# Altium integrated library Dip_Switches_rev15a.intlib: 131 symbols (part 1 of 2) (continued)
## WE-Dip Switches WS-DITU 418217170909
designator SW?
WS-DITU 2.54 mm right angled compact THT Dip Switch with flat actuator; Manufacturer: Würth Elektronik eiSos GmbH & Co.KG; ComponentLink1 Description: Manufacturer; ComponentLink2 Description: Datasheet; Creat by: Karrer Zheng; NoPins: 18; Creat Date: 13 February 2014; partNo: 418217170909; ComponentLink1URL: http://www.we-online.com; ComponentLink2URL: http://katalog.we-online.de/em/datasheet/4182171709xx.pdf
footprint 418217170909 (09p, 2.54mm Pitch, Right Angled, Box Type, THT, flat Actuator, red, without Tape, Tube)
pins: 1, 2, 3, 4, 5, 6, 7, 8, 9, 10, 11, 12, 13, 14, 15, 16, 17, 18

## WE-Dip Switches WS-DITU 418217170910
designator SW?
WS-DITU 2.54 mm right angled compact THT Dip Switch with flat actuator; Manufacturer: Würth Elektronik eiSos GmbH & Co.KG; ComponentLink1 Description: Manufacturer; ComponentLink2 Description: Datasheet; Creat by: Karrer Zheng; NoPins: 20; Creat Date: 13 February 2014; partNo: 418217170910; ComponentLink1URL: http://www.we-online.com; ComponentLink2URL: http://katalog.we-online.de/em/datasheet/4182171709xx.pdf
footprint 418217170910 (10p, 2.54mm Pitch, Right Angled, Box Type, THT,flat Actuator, red, without Tape, Tube)
pins: 1, 2, 3, 4, 5, 6, 7, 8, 9, 10, 11, 12, 13, 14, 15, 16, 17, 18, 19, 20

## WE-Dip Switches WS-DITU 418217170912
designator SW?
WS-DITU 2.54 mm right angled compact THT Dip Switch with flat actuator; Manufacturer: Würth Elektronik eiSos GmbH & Co.KG; ComponentLink1 Description: Manufacturer; ComponentLink2 Description: Datasheet; Creat by: Karrer Zheng; NoPins: 24; Creat Date: 13 February 2014; partNo: 418217170912; ComponentLink1URL: http://www.we-online.com; ComponentLink2URL: http://katalog.we-online.de/em/datasheet/4182171709xx.pdf
footprint 418217170912 (12p, 2.54mm Pitch, Right Angled, Box Type, THT, flat Actuator, red, without Tape, Tube)
pins: 1, 2, 3, 4, 5, 6, 7, 8, 9, 10, 11, 12, 13, 14, 15, 16, 17, 18, 19, 20, 21, 22, 23, 24


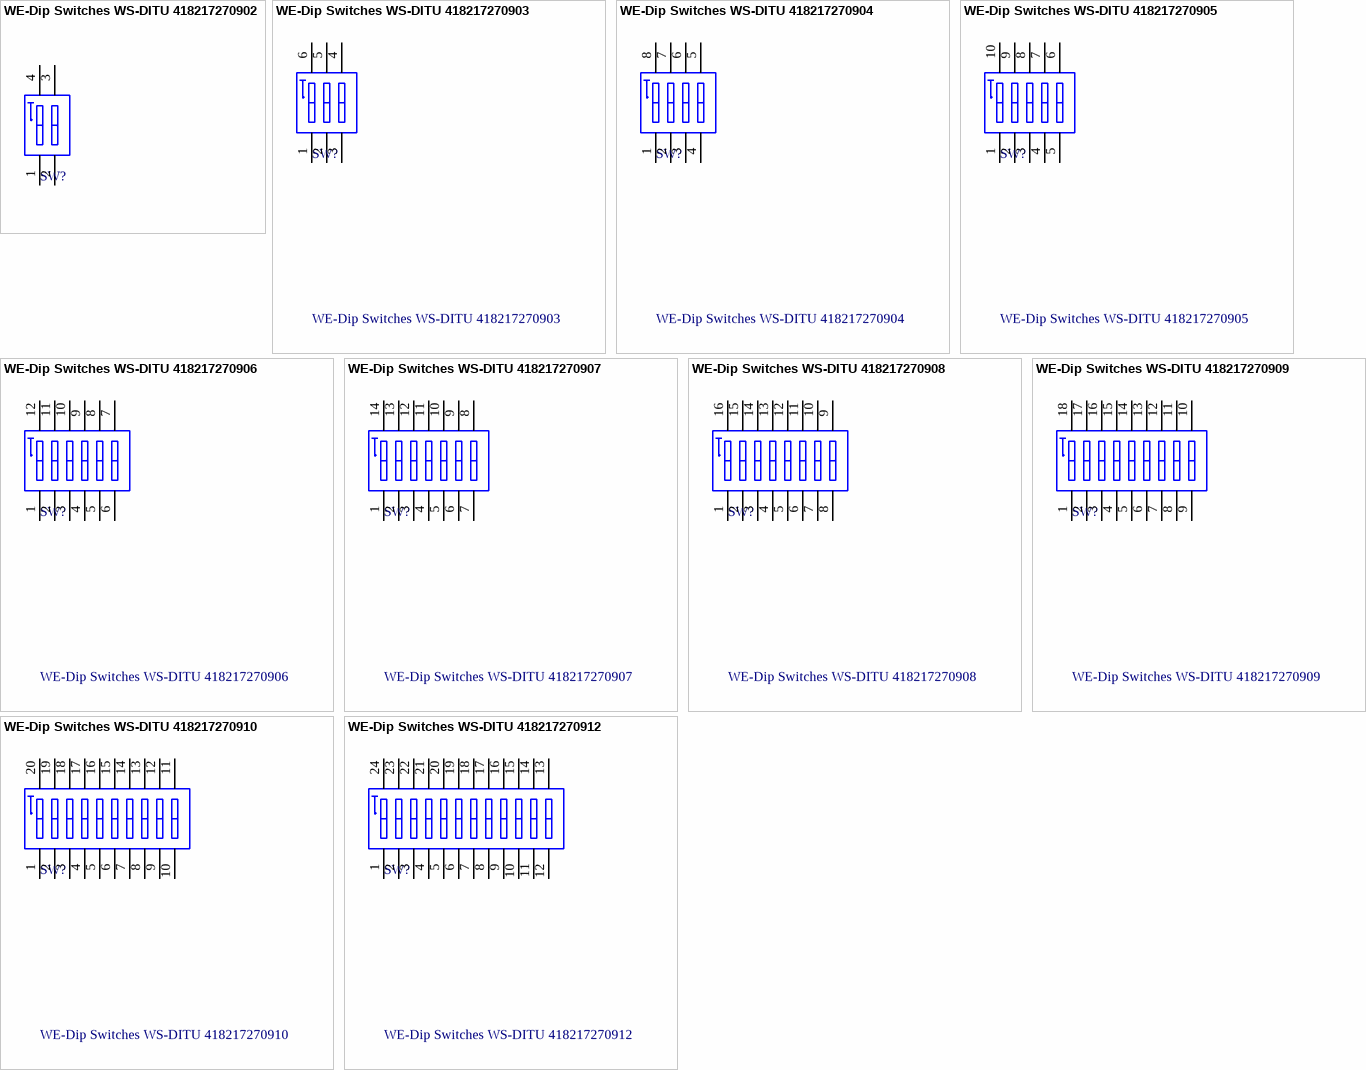
[diagram p6: symbols WE-Dip Switches WS-DITU 418217270902 to WE-Dip Switches WS-DITU 418217270912]

## WE-Dip Switches WS-DITU 418217270902
designator SW?
WS-DITU 2.54 mm right angled compact THT Dip Switch with raised actuator; Manufacturer: Würth Elektronik eiSos GmbH & Co.KG; ComponentLink1 Description: Manufacturer; ComponentLink2 Description: Datasheet; Creat by: Karrer Zheng; NoPins: 4; Creat Date: 13 February 2014; partNo: 418217270902; ComponentLink1URL: http://www.we-online.com; ComponentLink2URL: http://katalog.we-online.de/em/datasheet/4182172709xx.pdf
footprint 418217270902 (02p, 2.54mm Pitch, Right Angled, Box Type, THT, raised Actuator, red, without Tape, Tube)
pins: 1, 2, 3, 4

## WE-Dip Switches WS-DITU 418217270903
designator SW?
WS-DITU 2.54 mm right angled compact THT Dip Switch with raised actuator; Manufacturer: Würth Elektronik eiSos GmbH & Co.KG; ComponentLink1 Description: Manufacturer; ComponentLink2 Description: Datasheet; Creat by: Karrer Zheng; NoPins: 6; Creat Date: 13 February 2014; partNo: 418217270903; ComponentLink1URL: http://www.we-online.com; ComponentLink2URL: http://katalog.we-online.de/em/datasheet/4182172709xx.pdf
footprint 418217270903 (03p, 2.54mm Pitch, Right Angled, Box Type, THT, raised Actuator, red, without Tape, Tube)
pins: 1, 2, 3, 4, 5, 6

## WE-Dip Switches WS-DITU 418217270904
designator SW?
WS-DITU 2.54 mm right angled compact THT Dip Switch with raised actuator; Manufacturer: Würth Elektronik eiSos GmbH & Co.KG; ComponentLink1 Description: Manufacturer; ComponentLink2 Description: Datasheet; Creat by: Karrer Zheng; NoPins: 8; Creat Date: 13 February 2014; partNo: 418217270904; ComponentLink1URL: http://www.we-online.com; ComponentLink2URL: http://katalog.we-online.de/em/datasheet/4182172709xx.pdf
footprint 418217270904 (04p, 2.54mm Pitch, Right Angled, Box Type, THT, raised Actuator, red, without Tape, Tube)
pins: 1, 2, 3, 4, 5, 6, 7, 8

## WE-Dip Switches WS-DITU 418217270905
designator SW?
WS-DITU 2.54 mm right angled compact THT Dip Switch with raised actuator; Manufacturer: Würth Elektronik eiSos GmbH & Co.KG; ComponentLink1 Description: Manufacturer; ComponentLink2 Description: Datasheet; Creat by: Karrer Zheng; NoPins: 10; Creat Date: 13 February 2014; partNo: 418217270905; ComponentLink1URL: http://www.we-online.com; ComponentLink2URL: http://katalog.we-online.de/em/datasheet/4182172709xx.pdf
footprint 418217270905 (05p, 2.54mm Pitch, Right Angled, Box Type, THT, raised Actuator, red, without Tape, Tube)
pins: 1, 2, 3, 4, 5, 6, 7, 8, 9, 10

## WE-Dip Switches WS-DITU 418217270906
designator SW?
WS-DITU 2.54 mm right angled compact THT Dip Switch with raised actuator; Manufacturer: Würth Elektronik eiSos GmbH & Co.KG; ComponentLink1 Description: Manufacturer; ComponentLink2 Description: Datasheet; Creat by: Karrer Zheng; NoPins: 12; Creat Date: 13 February 2014; partNo: 418217270906; ComponentLink1URL: http://www.we-online.com; ComponentLink2URL: http://katalog.we-online.de/em/datasheet/4182172709xx.pdf
footprint 418217270906 (06p, 2.54mm Pitch, Right Angled, Box Type, THT, raised Actuator, red, without Tape, Tube)
pins: 1, 2, 3, 4, 5, 6, 7, 8, 9, 10, 11, 12

## WE-Dip Switches WS-DITU 418217270907
designator SW?
WS-DITU 2.54 mm right angled compact THT Dip Switch with raised actuator; Manufacturer: Würth Elektronik eiSos GmbH & Co.KG; ComponentLink1 Description: Manufacturer; ComponentLink2 Description: Datasheet; Creat by: Karrer Zheng; NoPins: 14; Creat Date: 13 February 2014; partNo: 418217270907; ComponentLink1URL: http://www.we-online.com; ComponentLink2URL: http://katalog.we-online.de/em/datasheet/4182172709xx.pdf
footprint 418217270907 (07p, 2.54mm Pitch, Right Angled, Box Type, THT, raised Actuator, red, without Tape, Tube)
pins: 1, 2, 3, 4, 5, 6, 7, 8, 9, 10, 11, 12, 13, 14

## WE-Dip Switches WS-DITU 418217270908
designator SW?
WS-DITU 2.54 mm right angled compact THT Dip Switch with raised actuator; Manufacturer: Würth Elektronik eiSos GmbH & Co.KG; ComponentLink1 Description: Manufacturer; ComponentLink2 Description: Datasheet; Creat by: Karrer Zheng; NoPins: 16; Creat Date: 13 February 2014; partNo: 418217270908; ComponentLink1URL: http://www.we-online.com; ComponentLink2URL: http://katalog.we-online.de/em/datasheet/4182172709xx.pdf
footprint 418217270908 (08p, 2.54mm Pitch, Right Angled, Box Type, THT, raised Actuator, red, without Tape, Tube)
pins: 1, 2, 3, 4, 5, 6, 7, 8, 9, 10, 11, 12, 13, 14, 15, 16

## WE-Dip Switches WS-DITU 418217270909
designator SW?
WS-DITU 2.54 mm right angled compact THT Dip Switch with raised actuator; Manufacturer: Würth Elektronik eiSos GmbH & Co.KG; ComponentLink1 Description: Manufacturer; ComponentLink2 Description: Datasheet; Creat by: Karrer Zheng; NoPins: 18; Creat Date: 13 February 2014; partNo: 418217270909; ComponentLink1URL: http://www.we-online.com; ComponentLink2URL: http://katalog.we-online.de/em/datasheet/4182172709xx.pdf
footprint 418217270909 (09p, 2.54mm Pitch, Right Angled, Box Type, THT, raised Actuator, red, without Tape, Tube)
pins: 1, 2, 3, 4, 5, 6, 7, 8, 9, 10, 11, 12, 13, 14, 15, 16, 17, 18

## WE-Dip Switches WS-DITU 418217270910
designator SW?
WS-DITU 2.54 mm right angled compact THT Dip Switch with raised actuator; Manufacturer: Würth Elektronik eiSos GmbH & Co.KG; ComponentLink1 Description: Manufacturer; ComponentLink2 Description: Datasheet; Creat by: Karrer Zheng; NoPins: 20; Creat Date: 13 February 2014; partNo: 418217270910; ComponentLink1URL: http://www.we-online.com; ComponentLink2URL: http://katalog.we-online.de/em/datasheet/4182172709xx.pdf
footprint 418217270910 (10p, 2.54mm Pitch, Right Angled, Box Type, THT, raised Actuator, red, without Tape, Tube)
pins: 1, 2, 3, 4, 5, 6, 7, 8, 9, 10, 11, 12, 13, 14, 15, 16, 17, 18, 19, 20

## WE-Dip Switches WS-DITU 418217270912
designator SW?
WS-DITU 2.54 mm right angled compact THT Dip Switch with raised actuator; Manufacturer: Würth Elektronik eiSos GmbH & Co.KG; ComponentLink1 Description: Manufacturer; ComponentLink2 Description: Datasheet; Creat by: Karrer Zheng; NoPins: 24; Creat Date: 13 February 2014; partNo: 418217270912; ComponentLink1URL: http://www.we-online.com; ComponentLink2URL: http://katalog.we-online.de/em/datasheet/4182172709xx.pdf
footprint 418217270912 (12p, 2.54mm Pitch, Right Angled, Box Type, THT, raised Actuator, red, without Tape, Tube)
pins: 1, 2, 3, 4, 5, 6, 7, 8, 9, 10, 11, 12, 13, 14, 15, 16, 17, 18, 19, 20, 21, 22, 23, 24


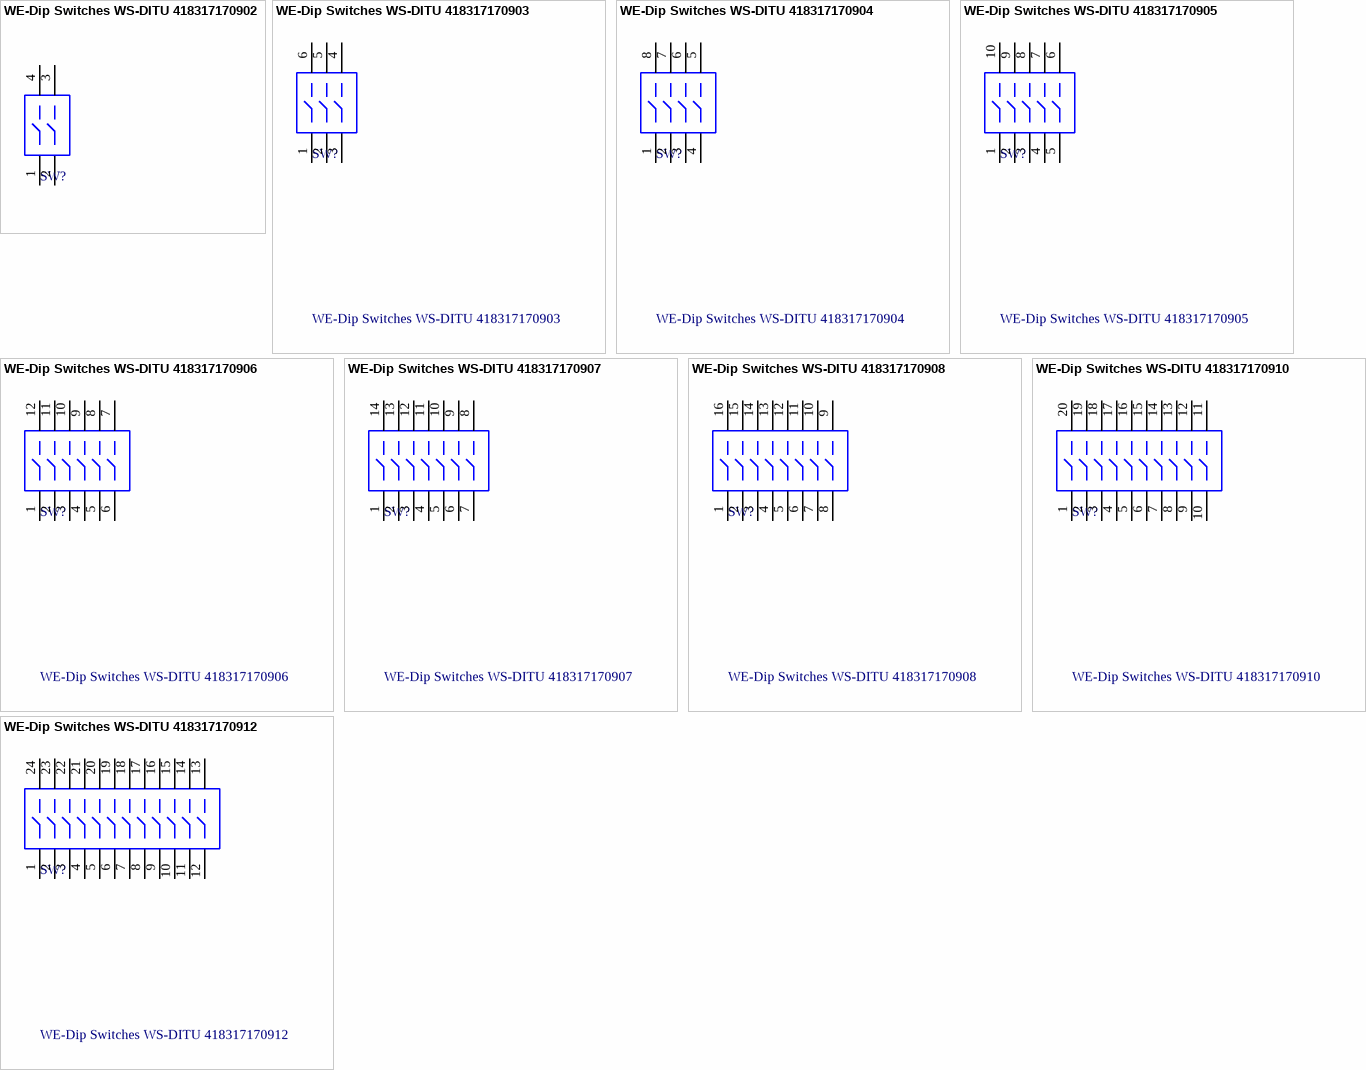
[diagram p7: symbols WE-Dip Switches WS-DITU 418317170902 to WE-Dip Switches WS-DITU 418317170912]

## WE-Dip Switches WS-DITU 418317170902
designator SW?
WS-DITU 2.54 mm piano type compact THT Dip Switch with flat actuator; Manufacturer: Würth Elektronik eiSos GmbH & Co.KG; ComponentLink1 Description: Manufacturer; ComponentLink2 Description: Datasheet; Creat by: Karrer Zheng; NoPins: 04; Creat Date: 14 February 2014; partNo: 418317170902; ComponentLink1URL: http://www.we-online.com; ComponentLink2URL: http://katalog.we-online.de/em/datasheet/4183171709xx.pdf
footprint 418317170902 (02p, 2.54mm Pitch, Piano, Box Type, THT, flat Actuator, black, without Tape, Tube)
pins: 1, 2, 3, 4

## WE-Dip Switches WS-DITU 418317170903
designator SW?
WS-DITU 2.54 mm piano type compact THT Dip Switch with flat actuator; Manufacturer: Würth Elektronik eiSos GmbH & Co.KG; ComponentLink1 Description: Manufacturer; ComponentLink2 Description: Datasheet; Creat by: Karrer Zheng; NoPins: 6; Creat Date: 14 February 2014; partNo: 418317170903; ComponentLink1URL: http://www.we-online.com; ComponentLink2URL: http://katalog.we-online.de/em/datasheet/4183171709xx.pdf
footprint 418317170903 (03p, 2.54mm Pitch, Piano, Box Type, THT, flat Actuator, black, without Tape, Tube)
pins: 1, 2, 3, 4, 5, 6

## WE-Dip Switches WS-DITU 418317170904
designator SW?
WS-DITU 2.54 mm piano type compact THT Dip Switch with flat actuator; Manufacturer: Würth Elektronik eiSos GmbH & Co.KG; ComponentLink1 Description: Manufacturer; ComponentLink2 Description: Datasheet; Creat by: Karrer Zheng; NoPins: 8; Creat Date: 14 February 2014; partNo: 418317170904; ComponentLink1URL: http://www.we-online.com; ComponentLink2URL: http://katalog.we-online.de/em/datasheet/4183171709xx.pdf
footprint 418317170904 (04p, 2.54mm Pitch, Piano, Box Type, THT, flat Actuator, black, without Tape, Tube)
pins: 1, 2, 3, 4, 5, 6, 7, 8

## WE-Dip Switches WS-DITU 418317170905
designator SW?
WS-DITU 2.54 mm piano type compact THT Dip Switch with flat actuator; Manufacturer: Würth Elektronik eiSos GmbH & Co.KG; ComponentLink1 Description: Manufacturer; ComponentLink2 Description: Datasheet; Creat by: Karrer Zheng; NoPins: 10; Creat Date: 14 February 2014; partNo: 418317170905; ComponentLink1URL: http://www.we-online.com; ComponentLink2URL: http://katalog.we-online.de/em/datasheet/4183171709xx.pdf
footprint 418317170905 (05p, 2.54mm Pitch, Piano, Box Type, THT, flat Actuator, black, without Tape, Tube)
pins: 1, 2, 3, 4, 5, 6, 7, 8, 9, 10

## WE-Dip Switches WS-DITU 418317170906
designator SW?
WS-DITU 2.54 mm piano type compact THT Dip Switch with flat actuator; Manufacturer: Würth Elektronik eiSos GmbH & Co.KG; ComponentLink1 Description: Manufacturer; ComponentLink2 Description: Datasheet; Creat by: Karrer Zheng; NoPins: 12; Creat Date: 14 February 2014; partNo: 418317170906; ComponentLink1URL: http://www.we-online.com; ComponentLink2URL: http://katalog.we-online.de/em/datasheet/4183171709xx.pdf
footprint 418317170906 (06p, 2.54mm Pitch, Piano, Box Type, THT, flat Actuator, black, without Tape, Tube)
pins: 1, 2, 3, 4, 5, 6, 7, 8, 9, 10, 11, 12

## WE-Dip Switches WS-DITU 418317170907
designator SW?
WS-DITU 2.54 mm piano type compact THT Dip Switch with flat actuator; Manufacturer: Würth Elektronik eiSos GmbH & Co.KG; ComponentLink1 Description: Manufacturer; ComponentLink2 Description: Datasheet; Creat by: Karrer Zheng; NoPins: 14; Creat Date: 14 February 2014; partNo: 418317170907; ComponentLink1URL: http://www.we-online.com; ComponentLink2URL: http://katalog.we-online.de/em/datasheet/4183171709xx.pdf
footprint 418317170907 (07p, 2.54mm Pitch, Piano, Box Type, THT, flat Actuator, black, without Tape, Tube)
pins: 1, 2, 3, 4, 5, 6, 7, 8, 9, 10, 11, 12, 13, 14

## WE-Dip Switches WS-DITU 418317170908
designator SW?
WS-DITU 2.54 mm piano type compact THT Dip Switch with flat actuator; Manufacturer: Würth Elektronik eiSos GmbH & Co.KG; ComponentLink1 Description: Manufacturer; ComponentLink2 Description: Datasheet; Creat by: Karrer Zheng; NoPins: 16; Creat Date: 14 February 2014; partNo: 418317170908; ComponentLink1URL: http://www.we-online.com; ComponentLink2URL: http://katalog.we-online.de/em/datasheet/4183171709xx.pdf
footprint 418317170908 (08p, 2.54mm Pitch, Piano, Box Type, THT, flat Actuator, black, without Tape, Tube)
pins: 1, 2, 3, 4, 5, 6, 7, 8, 9, 10, 11, 12, 13, 14, 15, 16

## WE-Dip Switches WS-DITU 418317170910
designator SW?
WS-DITU 2.54 mm piano type compact THT Dip Switch with flat actuator; Manufacturer: Würth Elektronik eiSos GmbH & Co.KG; ComponentLink1 Description: Manufacturer; ComponentLink2 Description: Datasheet; Creat by: Karrer Zheng; NoPins: 20; Creat Date: 14 February 2014; partNo: 418317170910; ComponentLink1URL: http://www.we-online.com; ComponentLink2URL: http://katalog.we-online.de/em/datasheet/4183171709xx.pdf
footprint 418317170910 (10p, 2.54mm Pitch, Piano, Box Type, THT, flat Actuator, black, without Tape, Tube)
pins: 1, 2, 3, 4, 5, 6, 7, 8, 9, 10, 11, 12, 13, 14, 15, 16, 17, 18, 19, 20

## WE-Dip Switches WS-DITU 418317170912
designator SW?
WS-DITU 2.54 mm piano type compact THT Dip Switch with flat actuator; Manufacturer: Würth Elektronik eiSos GmbH & Co.KG; ComponentLink1 Description: Manufacturer; ComponentLink2 Description: Datasheet; Creat by: Karrer Zheng; NoPins: 24; Creat Date: 14 February 2014; partNo: 418317170912; ComponentLink1URL: http://www.we-online.com; ComponentLink2URL: http://katalog.we-online.de/em/datasheet/4183171709xx.pdf
footprint 418317170912 (12p, 2.54mm Pitch, Piano, Box Type, THT, flat Actuator, black, without Tape, Tube)
pins: 1, 2, 3, 4, 5, 6, 7, 8, 9, 10, 11, 12, 13, 14, 15, 16, 17, 18, 19, 20, 21, 22, 23, 24


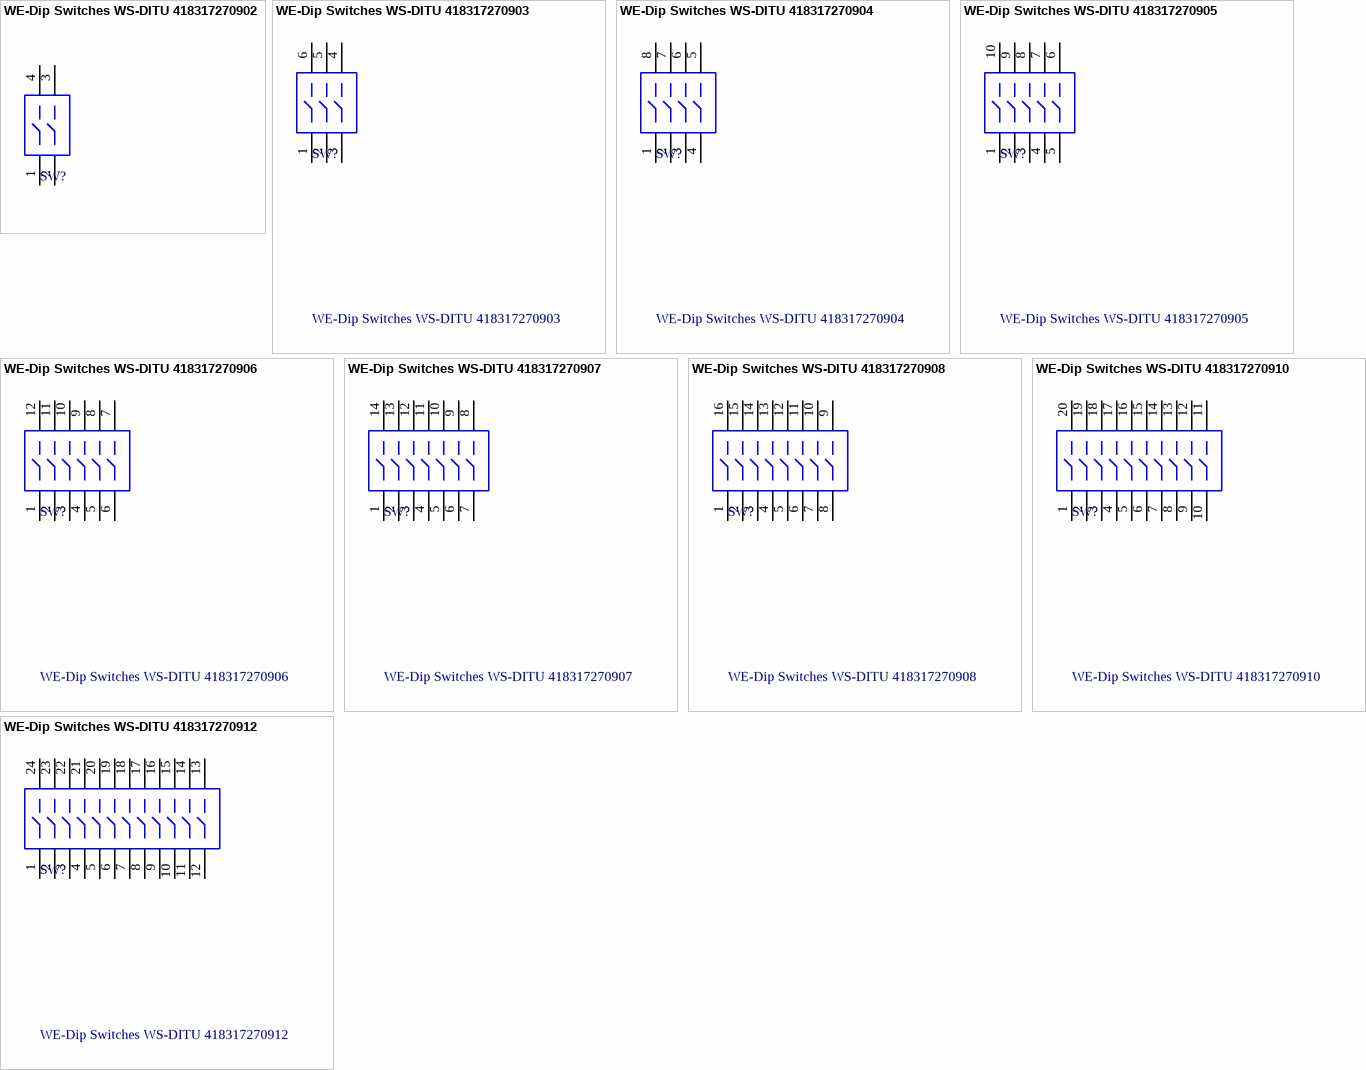
[diagram p8: symbols WE-Dip Switches WS-DITU 418317270902 to WE-Dip Switches WS-DITU 418317270912]

## WE-Dip Switches WS-DITU 418317270902
designator SW?
WS-DITU 2.54 mm piano type compact THT Dip Switch with raised actuator; Manufacturer: Würth Elektronik eiSos GmbH & Co.KG; ComponentLink1 Description: Manufacturer; ComponentLink2 Description: Datasheet; Creat by: Karrer Zheng; NoPins: 4; Creat Date: 14 February 2014; partNo: 418317270902; ComponentLink1URL: http://www.we-online.com; ComponentLink2URL: http://katalog.we-online.de/em/datasheet/4183172709xx.pdf
footprint 418317270902 (02p, 2.54mm Pitch, Piano, Box Type, THT, raised Actuator, black, without Tape, Tube)
pins: 1, 2, 3, 4

## WE-Dip Switches WS-DITU 418317270903
designator SW?
WS-DITU 2.54 mm piano type compact THT Dip Switch with raised actuator; Manufacturer: Würth Elektronik eiSos GmbH & Co.KG; ComponentLink1 Description: Manufacturer; ComponentLink2 Description: Datasheet; Creat by: Karrer Zheng; NoPins: 6; Creat Date: 14 February 2014; partNo: 418317270903; ComponentLink1URL: http://www.we-online.com; ComponentLink2URL: http://katalog.we-online.de/em/datasheet/4183172709xx.pdf
footprint 418317270903 (03p, 2.54mm Pitch, Piano, Box Type, THT, raised Actuator, black, without Tape, Tube)
pins: 1, 2, 3, 4, 5, 6

## WE-Dip Switches WS-DITU 418317270904
designator SW?
WS-DITU 2.54 mm piano type compact THT Dip Switch with raised actuator; Manufacturer: Würth Elektronik eiSos GmbH & Co.KG; ComponentLink1 Description: Manufacturer; ComponentLink2 Description: Datasheet; Creat by: Karrer Zheng; NoPins: 8; Creat Date: 14 February 2014; partNo: 418317270904; ComponentLink1URL: http://www.we-online.com; ComponentLink2URL: http://katalog.we-online.de/em/datasheet/4183172709xx.pdf
footprint 418317270904 (04p, 2.54mm Pitch, Piano, Box Type, THT, raised Actuator, black, without Tape, Tube)
pins: 1, 2, 3, 4, 5, 6, 7, 8

## WE-Dip Switches WS-DITU 418317270905
designator SW?
WS-DITU 2.54 mm piano type compact THT Dip Switch with raised actuator; Manufacturer: Würth Elektronik eiSos GmbH & Co.KG; ComponentLink1 Description: Manufacturer; ComponentLink2 Description: Datasheet; Creat by: Karrer Zheng; NoPins: 10; Creat Date: 14 February 2014; partNo: 418317270905; ComponentLink1URL: http://www.we-online.com; ComponentLink2URL: http://katalog.we-online.de/em/datasheet/4183172709xx.pdf
footprint 418317270905 (05p, 2.54mm Pitch, Piano, Box Type, THT, raised Actuator, black, without Tape, Tube)
pins: 1, 2, 3, 4, 5, 6, 7, 8, 9, 10

## WE-Dip Switches WS-DITU 418317270906
designator SW?
WS-DITU 2.54 mm piano type compact THT Dip Switch with raised actuator; Manufacturer: Würth Elektronik eiSos GmbH & Co.KG; ComponentLink1 Description: Manufacturer; ComponentLink2 Description: Datasheet; Creat by: Karrer Zheng; NoPins: 12; Creat Date: 14 February 2014; partNo: 418317270906; ComponentLink1URL: http://www.we-online.com; ComponentLink2URL: http://katalog.we-online.de/em/datasheet/4183172709xx.pdf
footprint 418317270906 (06p, 2.54mm Pitch, Piano, Box Type, THT, raised Actuator, black, without Tape, Tube)
pins: 1, 2, 3, 4, 5, 6, 7, 8, 9, 10, 11, 12

## WE-Dip Switches WS-DITU 418317270907
designator SW?
WS-DITU 2.54 mm piano type compact THT Dip Switch with raised actuator; Manufacturer: Würth Elektronik eiSos GmbH & Co.KG; ComponentLink1 Description: Manufacturer; ComponentLink2 Description: Datasheet; Creat by: Karrer Zheng; NoPins: 14; Creat Date: 14 February 2014; partNo: 418317270907; ComponentLink1URL: http://www.we-online.com; ComponentLink2URL: http://katalog.we-online.de/em/datasheet/4183172709xx.pdf
footprint 418317270907 (07p, 2.54mm Pitch, Piano, Box Type, THT, raised Actuator, black, without Tape, Tube)
pins: 1, 2, 3, 4, 5, 6, 7, 8, 9, 10, 11, 12, 13, 14

## WE-Dip Switches WS-DITU 418317270908
designator SW?
WS-DITU 2.54 mm piano type compact THT Dip Switch with raised actuator; Manufacturer: Würth Elektronik eiSos GmbH & Co.KG; ComponentLink1 Description: Manufacturer; ComponentLink2 Description: Datasheet; Creat by: Karrer Zheng; NoPins: 16; Creat Date: 14 February 2014; partNo: 418317270908; ComponentLink1URL: http://www.we-online.com; ComponentLink2URL: http://katalog.we-online.de/em/datasheet/4183172709xx.pdf
footprint 418317270908 (08p, 2.54mm Pitch, Piano, Box Type, THT, raised Actuator, black, without Tape, Tube)
pins: 1, 2, 3, 4, 5, 6, 7, 8, 9, 10, 11, 12, 13, 14, 15, 16

## WE-Dip Switches WS-DITU 418317270910
designator SW?
WS-DITU 2.54 mm piano type compact THT Dip Switch with raised actuator; Manufacturer: Würth Elektronik eiSos GmbH & Co.KG; ComponentLink1 Description: Manufacturer; ComponentLink2 Description: Datasheet; Creat by: Karrer Zheng; NoPins: 20; Creat Date: 14 February 2014; partNo: 418317270910; ComponentLink1URL: http://www.we-online.com; ComponentLink2URL: http://katalog.we-online.de/em/datasheet/4183172709xx.pdf
footprint 418317270910 (10p, 2.54mm Pitch, Piano, Box Type, THT, raised Actuator, black, without Tape, Tube)
pins: 1, 2, 3, 4, 5, 6, 7, 8, 9, 10, 11, 12, 13, 14, 15, 16, 17, 18, 19, 20

## WE-Dip Switches WS-DITU 418317270912
designator SW?
WS-DITU 2.54 mm piano type compact THT Dip Switch with raised actuator; Manufacturer: Würth Elektronik eiSos GmbH & Co.KG; ComponentLink1 Description: Manufacturer; ComponentLink2 Description: Datasheet; Creat by: Karrer Zheng; NoPins: 24; Creat Date: 14 February 2014; partNo: 418317270912; ComponentLink1URL: http://www.we-online.com; ComponentLink2URL: http://katalog.we-online.de/em/datasheet/4183172709xx.pdf
footprint 418317270912 (12p, 2.54mm Pitch, Piano, Box Type, THT, raised Actuator, black, without Tape, Tube)
pins: 1, 2, 3, 4, 5, 6, 7, 8, 9, 10, 11, 12, 13, 14, 15, 16, 17, 18, 19, 20, 21, 22, 23, 24


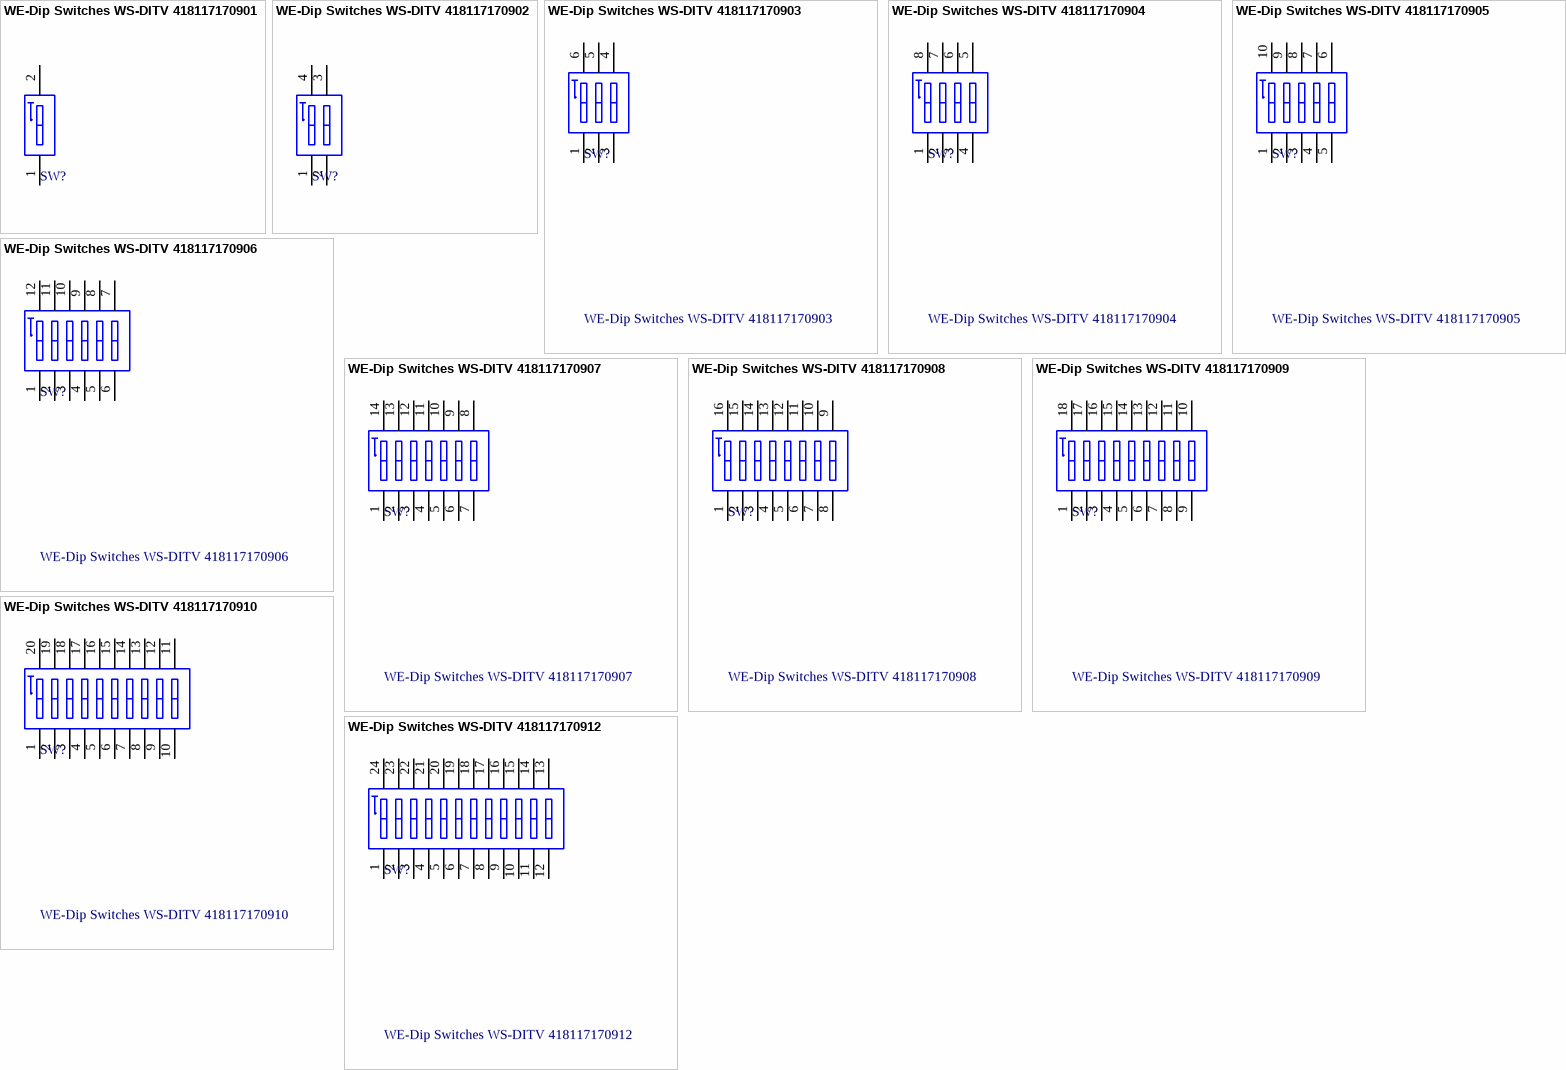
[diagram p9: symbols WE-Dip Switches WS-DITV 418117170901 to WE-Dip Switches WS-DITV 418117170912]

## WE-Dip Switches WS-DITV 418117170901
designator SW?
2.54 mm Compact THT Dip Switch with Flat Actuator WS-DITV; Manufacturer: Würth Elektronik eiSos GmbH & Co.KG; ComponentLink1 Description: Manufacturer; ComponentLink2 Description: Datasheet; Creat by: Karrer Zheng; NoPins: 2; Creat Date: 18 December 2013; partNo: 418117170901; ComponentLink1URL: http://www.we-online.com; ComponentLink2URL: http://katalog.we-online.de/em/datasheet/4181171709xx.pdf
footprint 418117170901 (01p, 2.54mm Pitch, Horizontal, Box Type, THT, flat Actuator, red, without Tape, Tube)
pins: 1, 2

## WE-Dip Switches WS-DITV 418117170902
designator SW?
2.54 mm Compact THT Dip Switch with Flat Actuator WS-DITV; Manufacturer: Würth Elektronik eiSos GmbH & Co.KG; ComponentLink1 Description: Manufacturer; ComponentLink2 Description: Datasheet; Creat by: Karrer Zheng; NoPins: 4; Creat Date: 18 December 2013; partNo: 418117170902; ComponentLink1URL: http://www.we-online.com; ComponentLink2URL: http://katalog.we-online.de/em/datasheet/4181171709xx.pdf
footprint 418117170902 (02p, 2.54mm Pitch, Horizontal, Box Type, THT, flat Actuator, red, without Tape, Tube)
pins: 1, 2, 3, 4

## WE-Dip Switches WS-DITV 418117170903
designator SW?
2.54 mm Compact THT Dip Switch with Flat Actuator WS-DITV; Manufacturer: Würth Elektronik eiSos GmbH & Co.KG; ComponentLink1 Description: Manufacturer; ComponentLink2 Description: Datasheet; Creat by: Karrer Zheng; NoPins: 6; Creat Date: 18 December 2013; partNo: 418117170903; ComponentLink1URL: http://www.we-online.com; ComponentLink2URL: http://katalog.we-online.de/em/datasheet/4181171709xx.pdf
footprint 418117170903 (03p, 2.54mm Pitch, Horizontal, Box Type, THT, flat Actuator, red, without Tape, Tube)
pins: 1, 2, 3, 4, 5, 6

## WE-Dip Switches WS-DITV 418117170904
designator SW?
2.54 mm Compact THT Dip Switch with Flat Actuator WS-DITV; Manufacturer: Würth Elektronik eiSos GmbH & Co.KG; ComponentLink1 Description: Manufacturer; ComponentLink2 Description: Datasheet; Creat by: Karrer Zheng; NoPins: 8; Creat Date: 18 December 2013; partNo: 418117170904; ComponentLink1URL: http://www.we-online.com; ComponentLink2URL: http://katalog.we-online.de/em/datasheet/4181171709xx.pdf
footprint 418117170904 (04p, 2.54mm Pitch, Horizontal, Box Type, THT, flat Actuator, red, without Tape, Tube)
pins: 1, 2, 3, 4, 5, 6, 7, 8

## WE-Dip Switches WS-DITV 418117170905
designator SW?
2.54 mm Compact THT Dip Switch with Flat Actuator WS-DITV; Manufacturer: Würth Elektronik eiSos GmbH & Co.KG; ComponentLink1 Description: Manufacturer; ComponentLink2 Description: Datasheet; Creat by: Karrer Zheng; NoPins: 10; Creat Date: 18 December 2013; partNo: 418117170905; ComponentLink1URL: http://www.we-online.com; ComponentLink2URL: http://katalog.we-online.de/em/datasheet/4181171709xx.pdf
footprint 418117170905 (05p, 2.54mm Pitch, Horizontal, Box Type, THT, flat Actuator, red, without Tape, Tube)
pins: 1, 2, 3, 4, 5, 6, 7, 8, 9, 10

## WE-Dip Switches WS-DITV 418117170906
designator SW?
2.54 mm Compact THT Dip Switch with Flat Actuator WS-DITV; Manufacturer: Würth Elektronik eiSos GmbH & Co.KG; ComponentLink1 Description: Manufacturer; ComponentLink2 Description: Datasheet; Creat by: Karrer Zheng; NoPins: 12; Creat Date: 18 December 2013; partNo: 418117170906; ComponentLink1URL: http://www.we-online.com; ComponentLink2URL: http://katalog.we-online.de/em/datasheet/4181171709xx.pdf
footprint 418117170906 (06p, 2.54mm Pitch, Horizontal, Box Type, THT, flat Actuator, red, without Tape, Tube)
pins: 1, 2, 3, 4, 5, 6, 7, 8, 9, 10, 11, 12

## WE-Dip Switches WS-DITV 418117170907
designator SW?
2.54 mm Compact THT Dip Switch with Flat Actuator WS-DITV; Manufacturer: Würth Elektronik eiSos GmbH & Co.KG; ComponentLink1 Description: Manufacturer; ComponentLink2 Description: Datasheet; Creat by: Karrer Zheng; NoPins: 14; Creat Date: 18 December 2013; partNo: 418117170907; ComponentLink1URL: http://www.we-online.com; ComponentLink2URL: http://katalog.we-online.de/em/datasheet/4181171709xx.pdf
footprint 418117170907 (07p, 2.54mm Pitch, Horizontal, Box Type, THT, flat Actuator, red, without Tape, Tube)
pins: 1, 2, 3, 4, 5, 6, 7, 8, 9, 10, 11, 12, 13, 14

## WE-Dip Switches WS-DITV 418117170908
designator SW?
2.54 mm Compact THT Dip Switch with Flat Actuator WS-DITV; Manufacturer: Würth Elektronik eiSos GmbH & Co.KG; ComponentLink1 Description: Manufacturer; ComponentLink2 Description: Datasheet; Creat by: Karrer Zheng; NoPins: 16; Creat Date: 18 December 2013; partNo: 418117170908; ComponentLink1URL: http://www.we-online.com; ComponentLink2URL: http://katalog.we-online.de/em/datasheet/4181171709xx.pdf
footprint 418117170908 (08p, 2.54mm Pitch, Horizontal, Box Type, THT, flat Actuator, red, without Tape, Tube)
pins: 1, 2, 3, 4, 5, 6, 7, 8, 9, 10, 11, 12, 13, 14, 15, 16

## WE-Dip Switches WS-DITV 418117170909
designator SW?
2.54 mm Compact THT Dip Switch with Flat Actuator WS-DITV; Manufacturer: Würth Elektronik eiSos GmbH & Co.KG; ComponentLink1 Description: Manufacturer; ComponentLink2 Description: Datasheet; Creat by: Karrer Zheng; NoPins: 18; Creat Date: 18 December 2013; partNo: 418117170909; ComponentLink1URL: http://www.we-online.com; ComponentLink2URL: http://katalog.we-online.de/em/datasheet/4181171709xx.pdf
footprint 418117170909 (09p, 2.54mm Pitch, Horizontal, Box Type, THT, flat Actuator, red, without Tape, Tube)
pins: 1, 2, 3, 4, 5, 6, 7, 8, 9, 10, 11, 12, 13, 14, 15, 16, 17, 18

## WE-Dip Switches WS-DITV 418117170910
designator SW?
2.54 mm Compact THT Dip Switch with Flat Actuator WS-DITV; Manufacturer: Würth Elektronik eiSos GmbH & Co.KG; ComponentLink1 Description: Manufacturer; ComponentLink2 Description: Datasheet; Creat by: Karrer Zheng; NoPins: 20; Creat Date: 18 December 2013; partNo: 418117170910; ComponentLink1URL: http://www.we-online.com; ComponentLink2URL: http://katalog.we-online.de/em/datasheet/4181171709xx.pdf
footprint 418117170910 (10p, 2.54mm Pitch, Horizontal, Box Type, THT, flat Actuator, red, without Tape, Tube)
pins: 1, 2, 3, 4, 5, 6, 7, 8, 9, 10, 11, 12, 13, 14, 15, 16, 17, 18, 19, 20

## WE-Dip Switches WS-DITV 418117170912
designator SW?
2.54 mm Compact THT Dip Switch with Flat Actuator WS-DITV; Manufacturer: Würth Elektronik eiSos GmbH & Co.KG; ComponentLink1 Description: Manufacturer; ComponentLink2 Description: Datasheet; Creat by: Karrer Zheng; NoPins: 24; Creat Date: 18 December 2013; partNo: 418117170912; ComponentLink1URL: http://www.we-online.com; ComponentLink2URL: http://katalog.we-online.de/em/datasheet/4181171709xx.pdf
footprint 418117170912 (12p, 2.54mm Pitch, Horizontal, Box Type, THT, flat Actuator, red, without Tape, Tube)
pins: 1, 2, 3, 4, 5, 6, 7, 8, 9, 10, 11, 12, 13, 14, 15, 16, 17, 18, 19, 20, 21, 22, 23, 24


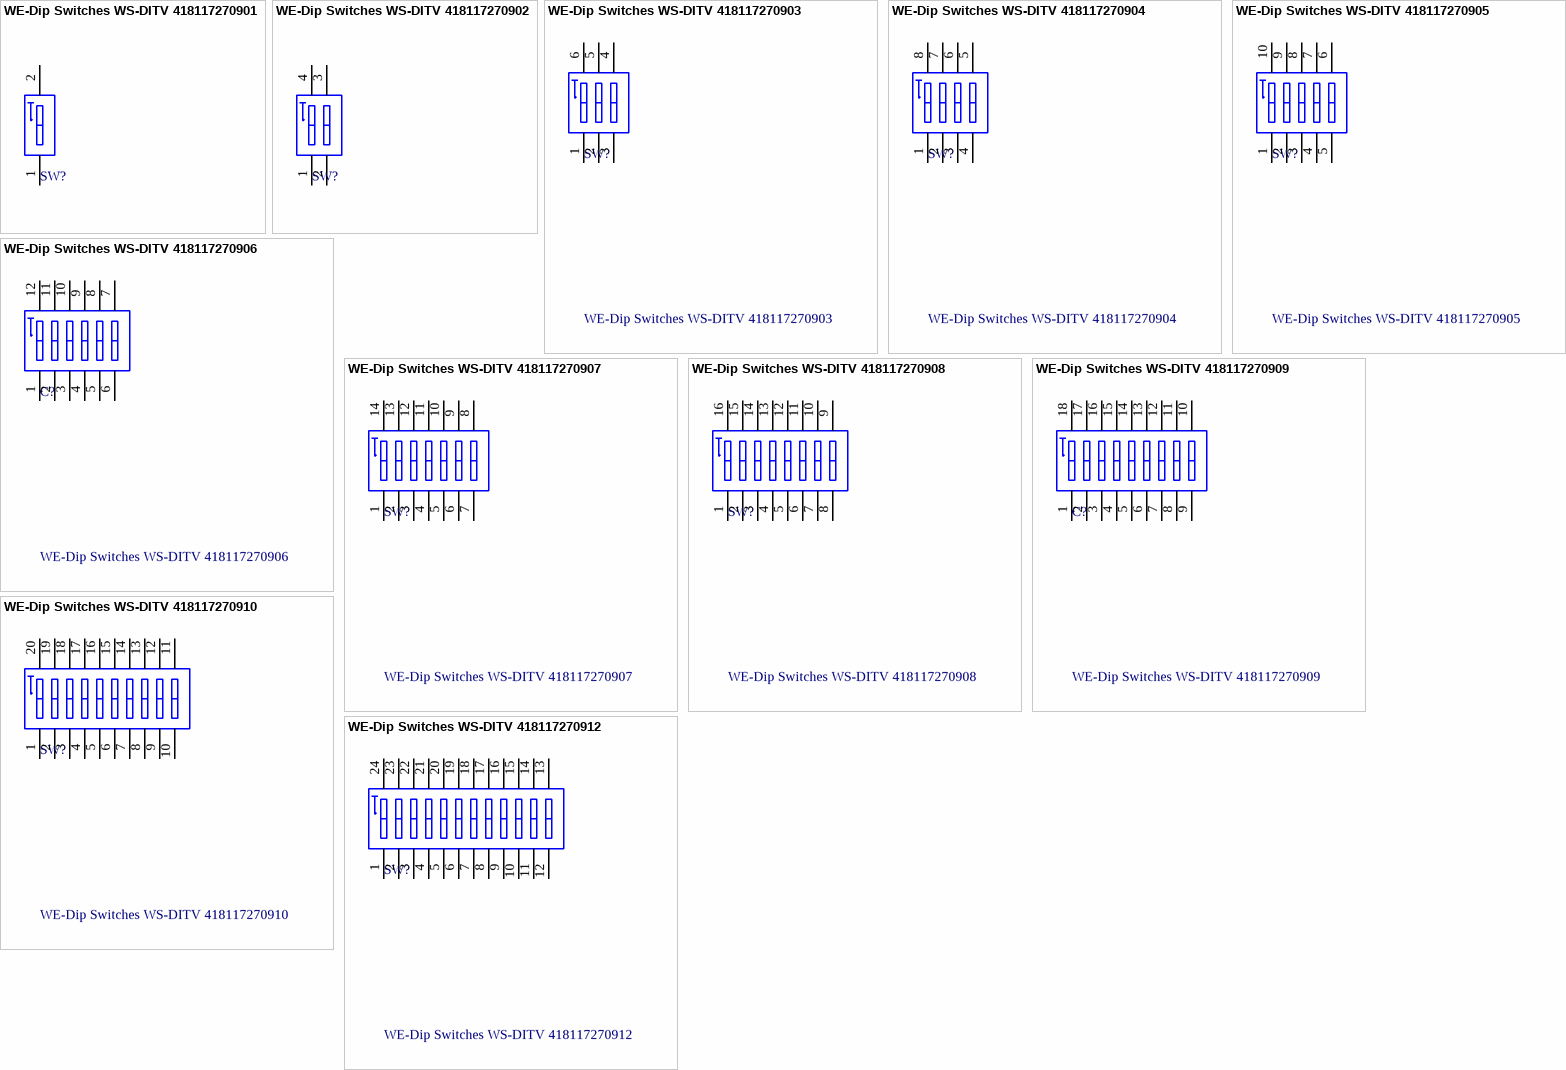
[diagram p10: symbols WE-Dip Switches WS-DITV 418117270901 to WE-Dip Switches WS-DITV 418117270912]

## WE-Dip Switches WS-DITV 418117270901
designator SW?
WS-DITV 2.54 mm Compact THT Dip Switch with Raised Actuator; Manufacturer: Würth Elektronik eiSos GmbH & Co.KG; ComponentLink1 Description: Manufacturer; ComponentLink2 Description: Datasheet; Creat by: Karrer Zheng; NoPins: 2; Creat Date: 17 December 2013; partNo: 418117270901; ComponentLink1URL: http://www.we-online.com; ComponentLink2URL: http://katalog.we-online.de/em/datasheet/4181172709xx.pdf
footprint 418117270901 (01p, 2.54mm Pitch, Horizontal, Box Type, THT, raised Actuator, red, without Tape, Tube)
pins: 1, 2

## WE-Dip Switches WS-DITV 418117270902
designator SW?
WS-DITV 2.54 mm Compact THT Dip Switch with Raised Actuator; Manufacturer: Würth Elektronik eiSos GmbH & Co.KG; ComponentLink1 Description: Manufacturer; ComponentLink2 Description: Datasheet; Creat by: Karrer Zheng; NoPins: 4; Creat Date: 17 December 2013; partNo: 418117270902; ComponentLink1URL: http://www.we-online.com; ComponentLink2URL: http://katalog.we-online.de/em/datasheet/4181172709xx.pdf
footprint 418117270902 (02p, 2.54mm Pitch, Horizontal, Box Type, THT, raised Actuator, red, without Tape, Tube)
pins: 1, 2, 3, 4

## WE-Dip Switches WS-DITV 418117270903
designator SW?
WS-DITV 2.54 mm Compact THT Dip Switch with Raised Actuator; Manufacturer: Würth Elektronik eiSos GmbH & Co.KG; ComponentLink1 Description: Manufacturer; ComponentLink2 Description: Datasheet; Creat by: Karrer Zheng; NoPins: 6; Creat Date: 17 December 2013; partNo: 418117270903; ComponentLink1URL: http://www.we-online.com; ComponentLink2URL: http://katalog.we-online.de/em/datasheet/4181172709xx.pdf
footprint 418117270903 (03p, 2.54mm Pitch, Horizontal, Box Type, THT, raised Actuator, red, without Tape, Tube)
pins: 1, 2, 3, 4, 5, 6

## WE-Dip Switches WS-DITV 418117270904
designator SW?
WS-DITV 2.54 mm Compact THT Dip Switch with Raised Actuator; Manufacturer: Würth Elektronik eiSos GmbH & Co.KG; ComponentLink1 Description: Manufacturer; ComponentLink2 Description: Datasheet; Creat by: Karrer Zheng; NoPins: 8; Creat Date: 17 December 2013; partNo: 418117270904; ComponentLink1URL: http://www.we-online.com; ComponentLink2URL: http://katalog.we-online.de/em/datasheet/4181172709xx.pdf
footprint 418117270904 (04p, 2.54mm Pitch, Horizontal, Box Type, THT, raised Actuator, red, without Tape, Tube)
pins: 1, 2, 3, 4, 5, 6, 7, 8

## WE-Dip Switches WS-DITV 418117270905
designator SW?
WS-DITV 2.54 mm Compact THT Dip Switch with Raised Actuator; Manufacturer: Würth Elektronik eiSos GmbH & Co.KG; ComponentLink1 Description: Manufacturer; ComponentLink2 Description: Datasheet; Creat by: Karrer Zheng; NoPins: 10; Creat Date: 17 December 2013; partNo: 418117270905; ComponentLink1URL: http://www.we-online.com; ComponentLink2URL: http://katalog.we-online.de/em/datasheet/4181172709xx.pdf
footprint 418117270905 (05p, 2.54mm Pitch, Horizontal, Box Type, THT, raised Actuator, red, without Tape, Tube)
pins: 1, 2, 3, 4, 5, 6, 7, 8, 9, 10

## WE-Dip Switches WS-DITV 418117270906
designator C?
WS-DITV 2.54 mm Compact THT Dip Switch with Raised Actuator; Manufacturer: Würth Elektronik eiSos GmbH & Co.KG; ComponentLink1 Description: Manufacturer; ComponentLink2 Description: Datasheet; Creat by: Karrer Zheng; NoPins: 12; Creat Date: 17 December 2013; partNo: 418117270906; ComponentLink1URL: http://www.we-online.com; ComponentLink2URL: http://katalog.we-online.de/em/datasheet/4181172709xx.pdf
footprint 418117270906 (06p, 2.54mm Pitch, Horizontal, Box Type, THT, raised Actuator, red, without Tape, Tube)
pins: 1, 2, 3, 4, 5, 6, 7, 8, 9, 10, 11, 12

## WE-Dip Switches WS-DITV 418117270907
designator SW?
WS-DITV 2.54 mm Compact THT Dip Switch with Raised Actuator; Manufacturer: Würth Elektronik eiSos GmbH & Co.KG; ComponentLink1 Description: Manufacturer; ComponentLink2 Description: Datasheet; Creat by: Karrer Zheng; NoPins: 14; Creat Date: 17 December 2013; partNo: 418117270907; ComponentLink1URL: http://www.we-online.com; ComponentLink2URL: http://katalog.we-online.de/em/datasheet/4181172709xx.pdf
footprint 418117270907 (07p, 2.54mm Pitch, Horizontal, Box Type, THT, raised Actuator, red, without Tape, Tube)
pins: 1, 2, 3, 4, 5, 6, 7, 8, 9, 10, 11, 12, 13, 14

## WE-Dip Switches WS-DITV 418117270908
designator SW?
WS-DITV 2.54 mm Compact THT Dip Switch with Raised Actuator; Manufacturer: Würth Elektronik eiSos GmbH & Co.KG; ComponentLink1 Description: Manufacturer; ComponentLink2 Description: Datasheet; Creat by: Karrer Zheng; NoPins: 16; Creat Date: 17 December 2013; partNo: 418117270908; ComponentLink1URL: http://www.we-online.com; ComponentLink2URL: http://katalog.we-online.de/em/datasheet/4181172709xx.pdf
footprint 418117270908 (08p, 2.54mm Pitch, Horizontal, Box Type, THT, raised Actuator, red, without Tape, Tube)
pins: 1, 2, 3, 4, 5, 6, 7, 8, 9, 10, 11, 12, 13, 14, 15, 16

## WE-Dip Switches WS-DITV 418117270909
designator C?
WS-DITV 2.54 mm Compact THT Dip Switch with Raised Actuator; Manufacturer: Würth Elektronik eiSos GmbH & Co.KG; ComponentLink1 Description: Manufacturer; ComponentLink2 Description: Datasheet; Creat by: Karrer Zheng; NoPins: 18; Creat Date: 17 December 2013; partNo: 418117270909; ComponentLink1URL: http://www.we-online.com; ComponentLink2URL: http://katalog.we-online.de/em/datasheet/4181172709xx.pdf
footprint 418117270909 (09p, 2.54mm Pitch, Horizontal, Box Type, THT, raised Actuator, red, without Tape, Tube)
pins: 1, 2, 3, 4, 5, 6, 7, 8, 9, 10, 11, 12, 13, 14, 15, 16, 17, 18

## WE-Dip Switches WS-DITV 418117270910
designator SW?
WS-DITV 2.54 mm Compact THT Dip Switch with Raised Actuator; Manufacturer: Würth Elektronik eiSos GmbH & Co.KG; ComponentLink1 Description: Manufacturer; ComponentLink2 Description: Datasheet; Creat by: Karrer Zheng; NoPins: 20; Creat Date: 17 December 2013; partNo: 418117270910; ComponentLink1URL: http://www.we-online.com; ComponentLink2URL: http://katalog.we-online.de/em/datasheet/4181172709xx.pdf
footprint 418117270910 (10p, 2.54mm Pitch, Horizontal, Box Type, THT, raised Actuator, red, without Tape, Tube)
pins: 1, 2, 3, 4, 5, 6, 7, 8, 9, 10, 11, 12, 13, 14, 15, 16, 17, 18, 19, 20

## WE-Dip Switches WS-DITV 418117270912
designator SW?
WS-DITV 2.54 mm Compact THT Dip Switch with Raised Actuator; Manufacturer: Würth Elektronik eiSos GmbH & Co.KG; ComponentLink1 Description: Manufacturer; ComponentLink2 Description: Datasheet; Creat by: Karrer Zheng; NoPins: 24; Creat Date: 17 December 2013; partNo: 418117270912; ComponentLink1URL: http://www.we-online.com; ComponentLink2URL: http://katalog.we-online.de/em/datasheet/4181172709xx.pdf
footprint 418117270912 (12p, 2.54mm Pitch, Horizontal, Box Type, THT, raised Actuator, red, without Tape, Tube)
pins: 1, 2, 3, 4, 5, 6, 7, 8, 9, 10, 11, 12, 13, 14, 15, 16, 17, 18, 19, 20, 21, 22, 23, 24


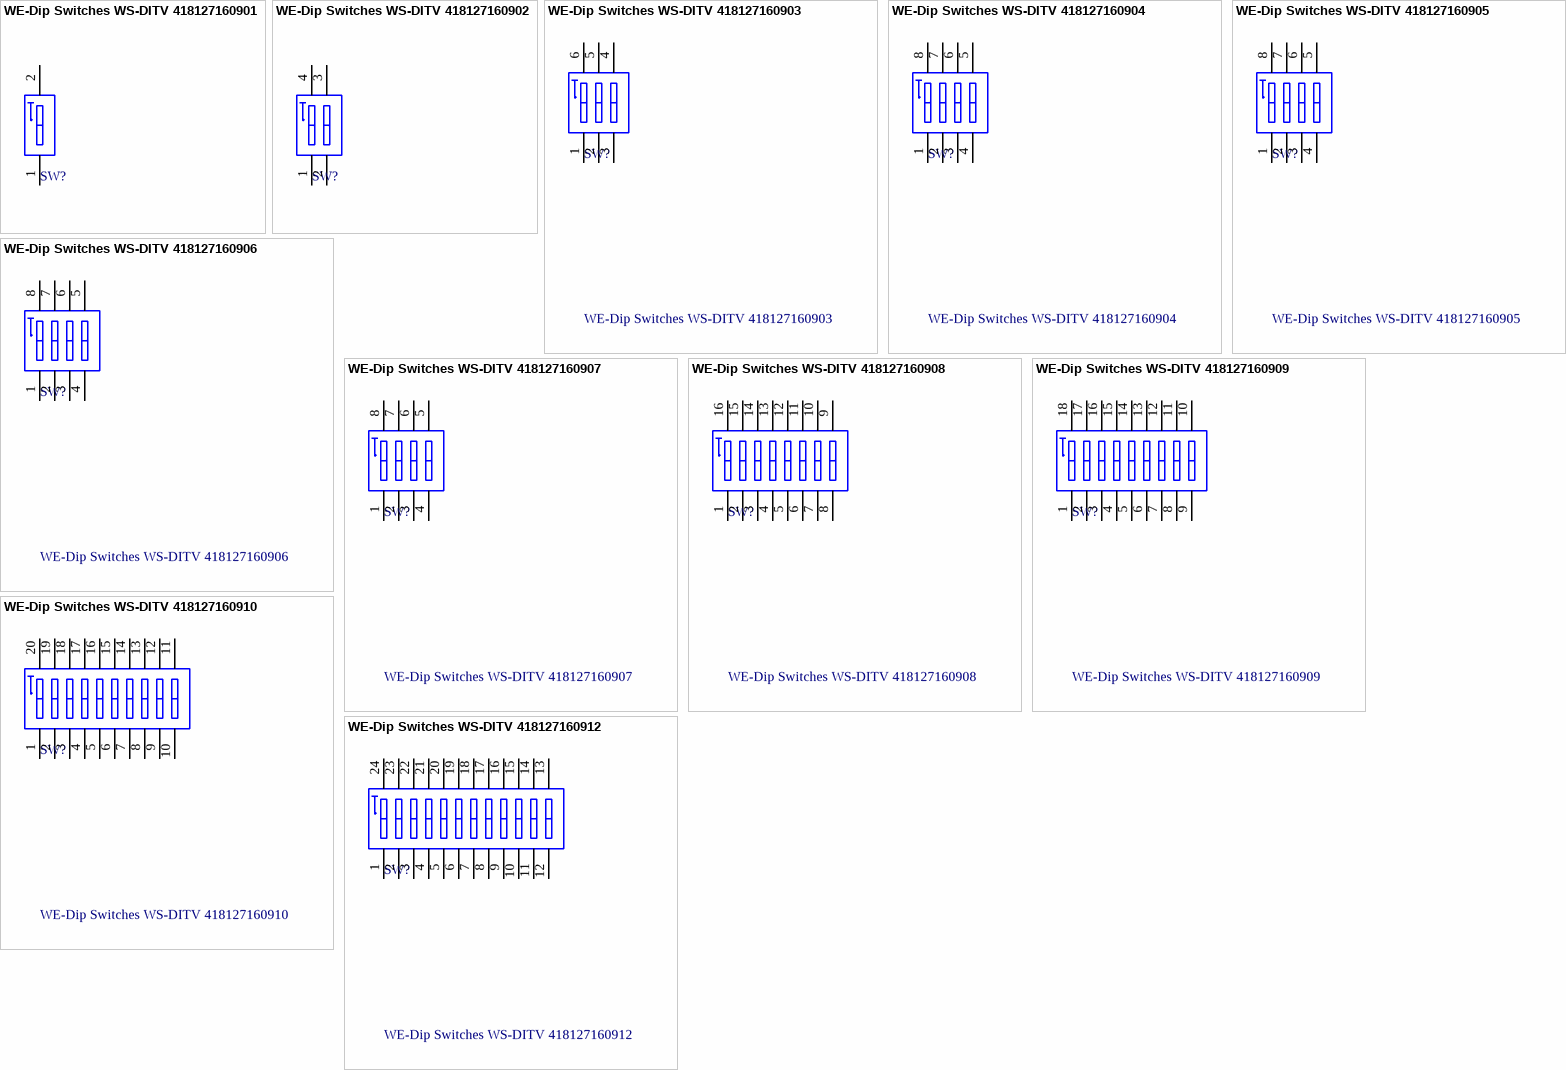
[diagram p11: symbols WE-Dip Switches WS-DITV 418127160901 to WE-Dip Switches WS-DITV 418127160912]